# Altium schematic symbol library SCHLIB.SchLib: 2608 symbols (part 2 of 20) (continued)
## CMC-SRF2012-361YA_V1
designator CMC?, comment Case/Package: 0805  Max DC Current: 300mA  (hidden comment: 360R)
CMC 300MA 2LN 360 OHM SMD; Manufacturer: Bourns; Manufacturer Part Number: SRF2012-361YA; Core Material: Ferrite; Tolerance: 25%; Shielding: Unshielded; Number of Lines: 2; DC Resistance (DCR): 450mR; Test Frequency: 100MHz; Voltage Rating (DC): 50V; Element Configuration: Dual; Insulation Resistance: 10MR; Washability: OK; Supplier 1: Digi-Key; Stock 1: 68554; Pricing 1: 1=0.36, 10=0.322, 100=0.2214, 500=0.18918, 1000=0.1449 (USD); Mount: PCB,Surface Mount; Material: Steel; Min Operating Temperature: -40°C; Max Operating Temperature: 125°C; Packaging: Tape and Reel; Package Quantity: 1; Resistance: 360R; Current Rating: 300mA; Termination: SMD/SMT; Current: 300mA; DC Current: 300mA; Length: 2mm; Height: 1.2mm; Width: 1.2mm; Depth: 1.4mm; REACH SVHC: No SVHC; Halogen Free: Halogen Free; ComponentLink1URL: https://www.bourns.com/docs/Product-Datasheets/SRF2012A.pdf; ComponentLink1Description: https://www.bourns.com/docs/Product-Datasheets/SRF2012A.pdf; ComponentLink2URL: http://www.bourns.com/docs/Product-Datasheets/SRF2012A.pdf; ComponentLink2Description: http://www.bourns.com/docs/Product-Datasheets/SRF2012A.pdf; ComponentLink3URL: http://uk.rs-online.com/webdocs/0fa5/0900766b80fa59a2.pdf; ComponentLink3Description: http://uk.rs-online.com/webdocs/0fa5/0900766b80fa59a2.pdf; Supplier Part Number 1: SRF2012-361YADKR-ND; Impedance: 360R
footprint CMC-SRF2012A
pins: 1, 2, 3, 4

## CMC-SRF2012-361YA_V2
designator CMC?, comment Case/Package: 0805  Max DC Current: 300mA  (hidden comment: 360R)
CMC 300MA 2LN 360 OHM SMD; Manufacturer: Bourns; Manufacturer Part Number: SRF2012-361YA; Core Material: Ferrite; Tolerance: 25%; Shielding: Unshielded; Number of Lines: 2; DC Resistance (DCR): 450mR; Test Frequency: 100MHz; Voltage Rating (DC): 50V; Element Configuration: Dual; Insulation Resistance: 10MR; Washability: OK; Supplier 1: Digi-Key; Stock 1: 68554; Pricing 1: 1=0.36, 10=0.322, 100=0.2214, 500=0.18918, 1000=0.1449 (USD); Mount: PCB,Surface Mount; Material: Steel; Min Operating Temperature: -40°C; Max Operating Temperature: 125°C; Packaging: Tape and Reel; Package Quantity: 1; Resistance: 360R; Current Rating: 300mA; Termination: SMD/SMT; Current: 300mA; DC Current: 300mA; Length: 2mm; Height: 1.2mm; Width: 1.2mm; Depth: 1.4mm; REACH SVHC: No SVHC; Halogen Free: Halogen Free; ComponentLink1URL: https://www.bourns.com/docs/Product-Datasheets/SRF2012A.pdf; ComponentLink1Description: https://www.bourns.com/docs/Product-Datasheets/SRF2012A.pdf; ComponentLink2URL: http://www.bourns.com/docs/Product-Datasheets/SRF2012A.pdf; ComponentLink2Description: http://www.bourns.com/docs/Product-Datasheets/SRF2012A.pdf; ComponentLink3URL: http://uk.rs-online.com/webdocs/0fa5/0900766b80fa59a2.pdf; ComponentLink3Description: http://uk.rs-online.com/webdocs/0fa5/0900766b80fa59a2.pdf; Supplier Part Number 1: SRF2012-361YADKR-ND; Impedance: 360R
footprint CMC-SRF2012A
pins: 1, 2, 3, 4

## CMC-SRF4532-510Y
designator CMC?, comment SRF4532-510Y  DC Current: 200mA  DC Resistance (DCR): 3.5R  Inductance: 51uH
CMC 51UH 200MA 2LN 2 KOHM SMD; Manufacturer 1: Bourns; Core Material: Ferrite; Number of Lines: 2; Impedance: 2kR; Tolerance: 50%; Voltage Rating (DC): 50V; Test Frequency: 100kHz; Element Configuration: Dual; Insulation Resistance: 10MR; Washability: OK; Supplier 1: Digi-Key; Manufacturer Part Number: SRF4532-510Y; Stock 1: 34702; Pricing 1: 1=0,83000, 10=0,72500, 100=0,51750 (USD); RoHS: Yes; Mount: Surface Mount,PCB; Case/Package: 4532; Material: Steel; Contact Plating: Tin; Min Operating Temperature: -40°C; Max Operating Temperature: 125°C; Package Quantity: 1; Packaging: Tape and Reel; Resistance: 2kR; Current Rating: 200mA; Current: 200mA; Max DC Current: 200mA; Termination: SMD/SMT; Self Resonant Frequency: 100kHz; Length: 4.5mm; Height: 0.118inch; Width: 0.126inch; Depth: 3.4mm; REACH SVHC: No SVHC; Lead Free: Lead Free; ComponentLink1URL: https://datasheet.ciiva.com/6216/srf4532-6216128.pdf?src-supplier=Digi-Key; ComponentLink1Description: https://datasheet.ciiva.com/6216/srf4532-6216128.pdf?src-supplier=Digi-Key; ComponentLink2URL: https://datasheet.ciiva.com/30121/119srf4532-30121267.pdf?src-supplier=Onlinecomponents.com; ComponentLink2Description: https://datasheet.ciiva.com/30121/119srf4532-30121267.pdf?src-supplier=Onlinecomponents.com; ComponentLink3URL: https://datasheet.ciiva.com/22628/1911192-22628124.pdf?src-supplier=Element14; ComponentLink3Description: https://datasheet.ciiva.com/22628/1911192-22628124.pdf?src-supplier=Element14; ComponentLink4URL: https://datasheet.ciiva.com/6216/srf4532-6216126.pdf?src-supplier=Digi-Key; ComponentLink4Description: https://datasheet.ciiva.com/6216/srf4532-6216126.pdf?src-supplier=Digi-Key; ComponentLink5URL: https://datasheet.ciiva.com/7847/srf4532-7847902.pdf?src-supplier=Element14; ComponentLink5Description: https://datasheet.ciiva.com/7847/srf4532-7847902.pdf?src-supplier=Element14; Supplier Part Number: SRF4532-510YCT-ND
footprint CMC-1812
pins: 1, 2, 3, 4

## CMC-WCB3225-102Y-N
designator CMC?, comment 1K  Max DC Current: 1.5A  Package: 1206
CHOKE COMMON MODE 1K/100MHz 1.5A SMD; Washability: OK; Parameter 2: *
footprint CMC-WCB3225-102Y-N
pins: 1, 2, 3, 4

## CON-1X2-2.54-TH
designator J?, comment 1X2
CONN HEADER VERT 2POS 2.54MM; Manufacturer: Harwin; Manufacturer Part Number: M20-9990245; Number of Contacts: 2; Current Rating: 3A; Contact Resistance: 25mR; Mating Cycles: 300; Voltage Rating (AC): 750V; Insulation Resistance: 10GR; Gender: Male; Connector Type: Male Pin; Voltage: 50V; Washability: OK; Supplier 1: Mouser; Stock 1: 28916; Pricing 1: 1=0.15, 10=0.093, 50=0.093, 100=0.085, 1000=0.061, 10000=0.051 (USD); Mount: Through Hole; Case/Package: SIL; Weight: 0.25lb; Contact Plating: Gold; Contact Material: Brass,Bronze; Color: Black; Housing Color: Black; Housing Material: Nylon; Min Operating Temperature: -40°C; Max Operating Temperature: 105°C; Number of Rows: 1; Termination: Solder; Max Current Rating: 3A; Number of Poles: 2; Package Quantity: 1000; Packaging: Bag; Number of Positions: 2; Working Voltage: 750V; Orientation: Straight; Current: 3A; Length: 5.08mm; Height: 0.12inch; Lead Pitch: 2.54mm; Width: 0.25inch; Pitch: 2.54mm; Contact Mating Length: 0.24inch; Depth: 2.54mm; Radiation Hardening: No; REACH SVHC: No SVHC; ComponentLink1URL: http://www.farnell.com/datasheets/1681551.pdf; ComponentLink1Description: http://www.farnell.com/datasheets/1681551.pdf; ComponentLink2URL: http://uk.rs-online.com/webdocs/1388/0900766b81388728.pdf; ComponentLink2Description: http://uk.rs-online.com/webdocs/1388/0900766b81388728.pdf; ComponentLink3URL: https://cdn.harwin.com/pdfs/Harwin_PC_Connectors_M20.pdf; ComponentLink3Description: https://cdn.harwin.com/pdfs/Harwin_PC_Connectors_M20.pdf; ComponentLink4URL: http://www.mouser.com/ds/2/181/Harwin_Product_Catalog_page_206-1134556.pdf; ComponentLink4Description: http://www.mouser.com/ds/2/181/Harwin_Product_Catalog_page_206-1134556.pdf; Supplier Part Number 1: 855-M20-9990245
footprint CON-1X2-TH
pins: 1 GND_IN, 2

## CON-1X2-4.2MM
designator J?, comment L-KLS1-4.20-1X02-S
CONN HEADER VERT 2POS; Manufacturer: Molex; Current Rating: 9A; Voltage Rating: 600V; Contact Resistance: 10mR; Max Voltage Rating (DC): 600.6kV; Number of Poles: 2; Max Current Rating: 15A; Connector Type: Power,Rectangular; Working Voltage: 250V; Gender: Male; Insulation Resistance: 1GR; Pitch: 4.2mm; Approvals: UL,CSA,TUV; Glow Wire Compliant: Non-compliant; Washability: OK; Supplier 1: Digi-Key; Manufacturer Part Number: 39-28-1023; Stock 1: 12755; Pricing 1: 1=0,65000, 10=0,61000, 100=0,46760, 500=0,40660, 1000=0,33545, 5000=0,29479, 10000=0,27446 (USD); RoHS: Yes; Mount: Through Hole; Contact Plating: Tin,Copper,Bright; Contact Material: Brass; Color: Natural,Clear; Housing Color: Black; Housing Material: Nylon; Min Operating Temperature: -40°C; Max Operating Temperature: 105°C; Number of Rows: 2; Package Quantity: 1200; Packaging: Bulk; Voltage Rating (AC): 600V; Contact Gender: Male; Number of Positions: 2; Termination: Solder; Number of Contacts: 2; Orientation: Straight; Voltage Rating (DC): 600V; Number of Circuits: 2; Length: 22.32mm; Height: 12mm; Lead Pitch: 4.2mm; Row Spacing: 4.2mm; Depth: 8.3mm; Radiation Hardening: No; REACH SVHC: Unknown; Halogen Free: Low Halogen; Lead Free: Lead Free; Flammability Rating: UL94 V-2; ComponentLink1URL: https://datasheet.ciiva.com/30094/32110039281023-pcb-headers-30094576.pdf?src-supplier=Onlinecomponents.com; ComponentLink1Description: https://datasheet.ciiva.com/30094/32110039281023-pcb-headers-30094576.pdf?src-supplier=Onlinecomponents.com; ComponentLink2URL: https://datasheet.ciiva.com/5157/0039281023-pcb-headers-228438-5157638.pdf?src-supplier=Mouser; ComponentLink2Description: https://datasheet.ciiva.com/5157/0039281023-pcb-headers-228438-5157638.pdf?src-supplier=Mouser; ComponentLink3URL: https://datasheet.ciiva.com/11746/0900766b80460d9e-11746456.pdf?src-supplier=RSComponents; ComponentLink3Description: https://datasheet.ciiva.com/11746/0900766b80460d9e-11746456.pdf?src-supplier=RSComponents; ComponentLink4URL: https://datasheet.ciiva.com/26921/getdatasheetpartid-293336-26921902.pdf?src-supplier=Verical; ComponentLink4Description: https://datasheet.ciiva.com/26921/getdatasheetpartid-293336-26921902.pdf?src-supplier=Verical; ComponentLink5URL: https://datasheet.ciiva.com/19462/1968742-19462127.pdf?src-supplier=Jameco; ComponentLink5Description: https://datasheet.ciiva.com/19462/1968742-19462127.pdf?src-supplier=Jameco; ComponentLink6URL: https://datasheet.ciiva.com/20209/22-3810e-20209528.pdf?src-supplier=Rapid+Electronics; ComponentLink6Description: https://datasheet.ciiva.com/20209/22-3810e-20209528.pdf?src-supplier=Rapid+Electronics; ComponentLink7URL: https://datasheet.ciiva.com/25908/0039281023-pcb-headers-25908412.pdf?src-supplier=Avnet+Europe; ComponentLink7Description: https://datasheet.ciiva.com/25908/0039281023-pcb-headers-25908412.pdf?src-supplier=Avnet+Europe; ComponentLink8URL: https://datasheet.ciiva.com/1442/1859939-1442781.pdf?src-supplier=Element14; ComponentLink8Description: https://datasheet.ciiva.com/1442/1859939-1442781.pdf?src-supplier=Element14; Supplier Part Number 1: WM3800-ND
footprint CON-1X2-4.2MM-TH
pins: 1, 2

## CON-1X3-2.54-TH
designator J?, comment 1X3
CONN HEADER VERT 3POS 2.54MM; Manufacturer: Wurth Electronics; Manufacturer Part Number: 61300311121; Number of Positions: 3; Connector Type: Male Pin; Gender: Male; Pitch: 0.1inch; Washability: OK; ComponentLink1URL: http://www.farnell.com/datasheets/1681551.pdf; ComponentLink1Description: http://www.farnell.com/datasheets/1681551.pdf; ComponentLink2URL: http://uk.rs-online.com/webdocs/1388/0900766b81388728.pdf; ComponentLink2Description: http://uk.rs-online.com/webdocs/1388/0900766b81388728.pdf; ComponentLink3URL: https://cdn.harwin.com/pdfs/Harwin_PC_Connectors_M20.pdf; ComponentLink3Description: https://cdn.harwin.com/pdfs/Harwin_PC_Connectors_M20.pdf; ComponentLink4URL: http://www.mouser.com/ds/2/181/Harwin_Product_Catalog_page_206-1134556.pdf; ComponentLink4Description: http://www.mouser.com/ds/2/181/Harwin_Product_Catalog_page_206-1134556.pdf; Supplier 1: Digi-Key; Supplier Part Number 1: 732-5316-ND; Stock: 99893; Pricing: 1=0.13, 10=0.106, 25=0.088, 50=0.074, 100=0.067, 1000=0.061 (USD); RoHS: Yes; Mount: Through Hole; Color: Black; Contact Plating: Gold; Contact Material: Copper; Packaging: Bulk; Termination: Solder; Number of Contacts: 3; Number of Rows: 1; Contact Mating Length: 0.236inch; REACH SVHC: Unknown; Lead Free: Lead Free; ComponentLink5URL: http://www.farnell.com/cad/1737268.pdf?src-supplier=Element14; ComponentLink5Description: http://www.farnell.com/cad/1737268.pdf?src-supplier=Element14; ComponentLink6URL: https://katalog.we-online.de/em/datasheet/6130xx11121.pdf?src-supplier=Digi-Key; ComponentLink6Description: https://katalog.we-online.de/em/datasheet/6130xx11121.pdf?src-supplier=Digi-Key
footprint CON-1X3-TH
pins: 1 GND_IN, 2, 3

## CON-2POS 2.5M M
designator J?, comment 22035025
CONN HEADER VERT 2POS 2.5MM; Manufacturer: Molex; Number of Positions: 2; Contact Resistance: 20mR; Gender: Male; Voltage Rating: 250V; Current Rating: 3A; Insulation Resistance: 1GR; Shrouded: Yes (With); Test Voltage: 1kV; Glow Wire Compliant: Non-compliant; Washability: OK; Supplier 1: Digi-Key; Manufacturer Part Number: 22-03-5025; Stock 1: 25337; Pricing 1: 1=0,44000, 10=0,40900, 100=0,31330, 500=0,27240, 1000=0,22473, 5000=0,19749, 10000=0,18387 (USD); RoHS: Yes; Mount: Through Hole; Housing Material: Nylon; Contact Plating: Tin; Contact Material: Brass; Material: Nylon; Min Operating Temperature: -40°C; Max Operating Temperature: 105°C; Number of Rows: 1; Packaging: Bulk; Termination: Through Hole; Orientation: Straight; Number of Contacts: 2; Package Quantity: 24000; Number of Circuits: 2; Contact Gender: Male; Number of Poles: 2; Voltage Rating (AC): 250V; Working Voltage: 250V; Voltage Rating (DC): 250V; Pitch: 2.5mm; Lead Pitch: 2.5mm; Radiation Hardening: No; REACH SVHC: Unknown; Lead Free: Lead Free; Flammability Rating: UL94 V-0; ComponentLink1URL: https://datasheet.ciiva.com/30129/138400022035025-pcb-headers-30129808.pdf?src-supplier=Onlinecomponents.com; ComponentLink1Description: https://datasheet.ciiva.com/30129/138400022035025-pcb-headers-30129808.pdf?src-supplier=Onlinecomponents.com; ComponentLink2URL: https://datasheet.ciiva.com/11746/0900766b80da7727-11746103.pdf?src-supplier=RSComponents; ComponentLink2Description: https://datasheet.ciiva.com/11746/0900766b80da7727-11746103.pdf?src-supplier=RSComponents; ComponentLink3URL: https://datasheet.ciiva.com/25908/0022035025-pcb-headers-25908169.pdf?src-supplier=Avnet+Europe; ComponentLink3Description: https://datasheet.ciiva.com/25908/0022035025-pcb-headers-25908169.pdf?src-supplier=Avnet+Europe; ComponentLink4URL: https://datasheet.ciiva.com/34303/1930681-34303310.pdf?src-supplier=Jameco; ComponentLink4Description: https://datasheet.ciiva.com/34303/1930681-34303310.pdf?src-supplier=Jameco; ComponentLink5URL: https://datasheet.ciiva.com/5153/0022035025-pcb-headers-158403-5153950.pdf?src-supplier=Mouser; ComponentLink5Description: https://datasheet.ciiva.com/5153/0022035025-pcb-headers-158403-5153950.pdf?src-supplier=Mouser; ComponentLink6URL: https://datasheet.ciiva.com/6009/1682252-6009099.pdf?src-supplier=Farnell; ComponentLink6Description: https://datasheet.ciiva.com/6009/1682252-6009099.pdf?src-supplier=Farnell; Supplier Part Number 1: WM18886-ND
footprint CON-2POS-2.5MM-VERT m
pins: 1 GND_IN, 2

## CON-2POS-2.5MM-RA
designator J?  Pitch: 2.5mm  Mount: TH  (hidden comment: *)
CONN HEADER 2POS 2.5MM R/A TIN; Manufacturer: Molex; Number of Contacts: 2; Gender: Male; Current Rating: 3A; Contact Resistance: 20mR; Max Voltage Rating (DC): 250.25kV; Max Voltage Rating (AC): 125V; Insulation Resistance: 1GR; Connector Type: Male Pin; Voltage Rating: 250V; Shrouded: Yes (With); Test Voltage: 1kV; Glow Wire Compliant: Non-compliant; Washability: OK; Supplier 1: Digi-Key; Manufacturer Part Number: 22-05-7025; Stock 1: 27470; Pricing 1: 1=0.61, 10=0.576, 100=0.4416, 500=0.384, 1000=0.3168, 5000=0.2784, 10000=0.2592 (USD); Contact Plating: Copper,Tin; Contact Material: Brass,Bronze,Tin; Housing Material: Nylon; Housing Colour: Natural; Colour: Natural; Material: Nylon,Polyamide; Insulation Material: Nylon; Min Operating Temperature: -40°C; Max Operating Temperature: 105°C; Number of Rows: 1; Packaging: Bulk; Termination: Solder; Orientation: Right Angle; Number of Positions: 2; Number of Poles: 2; Package Quantity: 1; Voltage Rating (AC): 250V; Working Voltage: 250V; Voltage Rating (DC): 250V; Number of Circuits: 2; Contact Gender: Male; Length: 7.65mm; Height: 5.7mm; Depth: 5.1mm; Contact Mating Length: 0.138inch; Lead Pitch: 2.5mm; Radiation Hardening: No; REACH SVHC: Unknown; Lead Free: Lead Free; Flammability Rating: UL94 V-0; ComponentLink1URL: http://www.molex.com/webdocs/datasheets/pdf/en-us/0022057025_PCB_HEADERS.pdf; ComponentLink1Description: http://www.molex.com/webdocs/datasheets/pdf/en-us/0022057025_PCB_HEADERS.pdf; ComponentLink2URL: http://www.mouser.com/ds/2/276/0022057025_PCB_HEADERS-158480.pdf; ComponentLink2Description: http://www.mouser.com/ds/2/276/0022057025_PCB_HEADERS-158480.pdf; ComponentLink3URL: https://www.molex.com/pdm_docs/sd/022057025_sd.pdf; ComponentLink3Description: https://www.molex.com/pdm_docs/sd/022057025_sd.pdf; ComponentLink4URL: http://www.farnell.com/datasheets/2165316.pdf; ComponentLink4Description: http://www.farnell.com/datasheets/2165316.pdf; ComponentLink5URL: http://uk.rs-online.com/webdocs/13c2/0900766b813c2def.pdf; ComponentLink5Description: http://uk.rs-online.com/webdocs/13c2/0900766b813c2def.pdf; ComponentLink6URL: http://www.jameco.com/Jameco/Products/ProdDS/2017869.pdf; ComponentLink6Description: http://www.jameco.com/Jameco/Products/ProdDS/2017869.pdf; Supplier Part Number 1: WM18900-ND
footprint CON-2POS-2.5MM-RA
pins: 1 GND_IN, 2

## CON-2POS-2.54MM-SMD
designator J?, comment 2.54MM
TERM BLK 2P SIDE ENT 2.54MM SMD; Manufacturer: HARTING Technology; Manufacturer Part Number: 14010213102000; Current Rating: 8.4A; Gender: Receptacle; Voltage Rating: 160V; Number of Levels: 1; Number of Positions Per Level: 2; Current: 6A; Pitch: 0.1inch; Wire Gauge (Max): 26AWG; Wire Gauge (Min): 20AWG; Supplier 1: Digi-Key; Supplier Part Number 1: 1195-3656-1-ND; Stock: 967; Pricing: 1=1.05, 10=0.926, 100=0.7986 (USD); RoHS: Yes; Mount: Surface Mount; Contact Material: Copper; Color: Black; Contact Plating: Tin; Housing Material: Polymer; Material: Polymer,Glass fibre; Min Operating Temperature: -40°C; Max Operating Temperature: 125°C; Termination: Screwless; Number of Rows: 2; Orientation: Horizontal; Packaging: Tape and Reel; Voltage: 160V; Number of Contacts: 2; Number of Poles: 2; Contact Gender: Female; Length: 9.77mm; Width: 9.2mm; Depth: 5mm; REACH SVHC: No SVHC; ComponentLink1URL: https://datasheet.ciiva.com/46428/1817031-46428378.pdf?src-supplier=Element14; ComponentLink1Description: https://datasheet.ciiva.com/46428/1817031-46428378.pdf?src-supplier=Element14
footprint CON-HARTING-2POS-2.54MM
pins: 1 GND_IN, 2, MP1, MP2

## CON-2POS-2MM-SMD
designator J?, comment 2MM
CONN HEADER VERT 2POS 2MM; Manufacturer: Sullins; Manufacturer Part Number: SWR201-NRTN-S02-SA-WH; Number of Positions: 2; Connector Type: Male Pin; Pitch: 0.079inch; Number of Contacts: 4; Mating Retention: Yes (With); Sealable: No (Without); Contact Current Rating: 3A; Wire/Cable Type: Discrete; Connector System: Wire-to-Board; Plating Thickness: 2.03um; Wire/Cable Gauge: 30AWG; PCB Thickness: 1.6mm; Tail Length: 3.4mm; Contact Post Length: 0.134inch; Washability: OK; Mount: Through Hole; Color: White; Contact Plating: Tin; Package Quantity: 2000; Number of Rows: 1; Packaging: Bulk; Termination: Solder; Lead Free: Lead Free; ComponentLink1URL: http://www1.futureelectronics.com/doc/SULLINS/SWR201-NRTN-SA-WH.pdf?src-supplier=Future+Electronics; ComponentLink1Description: http://www1.futureelectronics.com/doc/SULLINS/SWR201-NRTN-SA-WH.pdf?src-supplier=Future+Electronics; ComponentLink2URL: https://s3.amazonaws.com/catalogspreads-pdf/PAGE128%202mm%20SWR201%20SINGLE%20ROW%20WAFER%20ST%20RA.pdf?src-supplier=Digi-Key; ComponentLink2Description: https://s3.amazonaws.com/catalogspreads-pdf/PAGE128%202mm%20SWR201%20SINGLE%20ROW%20WAFER%20ST%20RA.pdf?src-supplier=Digi-Key; Contact Material: Copper Alloy; Housing Color: Natural; Housing Material: Thermoplastic; Contact Shape: Square; Min Operating Temperature: -13°C; Max Operating Temperature: 185°C; Contact Gender: Male; Orientation: Straight; Strain Relief: No (Without); Backwall/Post Interruptions: No (Without); Contact Retention: No (Without); PCB Mount Alignment: No (Without); Selectively Loaded: No (Without); Length: 10mm; Height: 0.239inch; Width: 0.185inch; Contact Mating Length: 0.132inch; Radiation Hardening: No; Flammability Rating: UL94 V-0; REACH SVHC: Unknown; ComponentLink3URL: http://www.onlinecomponents.com/productFiles/mf-AMP/pgurl_1735446-4.pdf?src-supplier=Onlinecomponents.com; ComponentLink3Description: http://www.onlinecomponents.com/productFiles/mf-AMP/pgurl_1735446-4.pdf?src-supplier=Onlinecomponents.com; ComponentLink4URL: https://www.te.com/commerce/DocumentDelivery/DDEController?Action=srchrtrv&DocNm=1735446&DocType=Customer+Drawing&DocLang=English&src-supplier=Digi-Key; ComponentLink4Description: https://www.te.com/commerce/DocumentDelivery/DDEController?Action=srchrtrv&DocNm=1735446&DocType=Customer+Drawing&DocLang=English&src-supplier=Digi-Key; Supplier 1: Digi-Key; Stock 1: 67422; Pricing 1: 1=0.11, 10=0.102, 100=0.0626, 500=0.05184, 1000=0.04536, 5000=0.03888, 10000=0.0378 (USD); Supplier Part Number 1: S9463-ND
footprint CON-2POS-2MM
pins: 1 GND_IN, 2, MP1 GND_IN, MP2 GND_IN

## CON-2POS-2MM-TH
designator J?, comment 2MM
CONN HEADER VERT 2POS 2MM; Manufacturer: Sullins; Manufacturer Part Number: SWR201-NRTN-S02-SA-WH; Number of Positions: 2; Connector Type: Male Pin; Pitch: 0.079inch; Number of Contacts: 4; Mating Retention: Yes (With); Sealable: No (Without); Contact Current Rating: 3A; Wire/Cable Type: Discrete; Connector System: Wire-to-Board; Plating Thickness: 2.03um; Wire/Cable Gauge: 30AWG; PCB Thickness: 1.6mm; Tail Length: 3.4mm; Contact Post Length: 0.134inch; Washability: OK; Mount: Through Hole; Color: White; Contact Plating: Tin; Package Quantity: 2000; Number of Rows: 1; Packaging: Bulk; Termination: Solder; Lead Free: Lead Free; ComponentLink1URL: http://www1.futureelectronics.com/doc/SULLINS/SWR201-NRTN-SA-WH.pdf?src-supplier=Future+Electronics; ComponentLink1Description: http://www1.futureelectronics.com/doc/SULLINS/SWR201-NRTN-SA-WH.pdf?src-supplier=Future+Electronics; ComponentLink2URL: https://s3.amazonaws.com/catalogspreads-pdf/PAGE128%202mm%20SWR201%20SINGLE%20ROW%20WAFER%20ST%20RA.pdf?src-supplier=Digi-Key; ComponentLink2Description: https://s3.amazonaws.com/catalogspreads-pdf/PAGE128%202mm%20SWR201%20SINGLE%20ROW%20WAFER%20ST%20RA.pdf?src-supplier=Digi-Key; Contact Material: Copper Alloy; Housing Color: Natural; Housing Material: Thermoplastic; Contact Shape: Square; Min Operating Temperature: -13°C; Max Operating Temperature: 185°C; Contact Gender: Male; Orientation: Straight; Strain Relief: No (Without); Backwall/Post Interruptions: No (Without); Contact Retention: No (Without); PCB Mount Alignment: No (Without); Selectively Loaded: No (Without); Length: 10mm; Height: 0.239inch; Width: 0.185inch; Contact Mating Length: 0.132inch; Radiation Hardening: No; Flammability Rating: UL94 V-0; REACH SVHC: Unknown; ComponentLink3URL: http://www.onlinecomponents.com/productFiles/mf-AMP/pgurl_1735446-4.pdf?src-supplier=Onlinecomponents.com; ComponentLink3Description: http://www.onlinecomponents.com/productFiles/mf-AMP/pgurl_1735446-4.pdf?src-supplier=Onlinecomponents.com; ComponentLink4URL: https://www.te.com/commerce/DocumentDelivery/DDEController?Action=srchrtrv&DocNm=1735446&DocType=Customer+Drawing&DocLang=English&src-supplier=Digi-Key; ComponentLink4Description: https://www.te.com/commerce/DocumentDelivery/DDEController?Action=srchrtrv&DocNm=1735446&DocType=Customer+Drawing&DocLang=English&src-supplier=Digi-Key; Supplier 1: Digi-Key; Stock 1: 67422; Pricing 1: 1=0.11, 10=0.102, 100=0.0626, 500=0.05184, 1000=0.04536, 5000=0.03888, 10000=0.0378 (USD); Supplier Part Number 1: S9463-ND
footprint CON-2POS-2MM-TH
pins: 1 GND_IN, 2

## CON-2POS-3.7MM-PLUG
designator J?, comment 3.7MM
CONN SSL PLUG 2POS 3.7MM SOLDER; Manufacturer: Molex; Manufacturer Part Number: 503469-0200; Number of Contacts: 2; Mating Cycles: 15; Gender: Male; Voltage Rating: 500V; Current Rating: 2A; Glow Wire Compliant: Non-compliant; Supplier 1: Digi-Key; Supplier Part Number 1: WM4555CT-ND; Stock: 835; Pricing: 1=0.63, 10=0.588, 100=0.4511, 500=0.3923 (USD); RoHS: Yes; Mount: Surface Mount; Contact Plating: Tin; Color: White; Contact Material: Bronze,Tin; Housing Material: Polyamide; Housing Color: White; Min Operating Temperature: -40°C; Max Operating Temperature: 85°C; Termination: Solder; Number of Rows: 1; Connector Type: Plug; Number of Positions: 2; Fastening Type: Latch; Number of Circuits: 2; Packaging: Tape and Reel; Package Quantity: 1500; Orientation: Right Angle; Length: 9.3mm; Pitch: 3.7mm; Depth: 11.2mm; Radiation Hardening: No; REACH SVHC: Unknown; ComponentLink1URL: https://datasheet.ciiva.com/16104/975935034690200-pcb-headers-16104784.pdf?src-supplier=Onlinecomponents.com; ComponentLink1Description: https://datasheet.ciiva.com/16104/975935034690200-pcb-headers-16104784.pdf?src-supplier=Onlinecomponents.com; ComponentLink2URL: https://datasheet.ciiva.com/30058/35735034690200-pcb-headers-30058320.pdf?src-supplier=Onlinecomponents.com; ComponentLink2Description: https://datasheet.ciiva.com/30058/35735034690200-pcb-headers-30058320.pdf?src-supplier=Onlinecomponents.com; ComponentLink3URL: https://datasheet.ciiva.com/755/5034690200-sd-755859.pdf?src-supplier=Digi-Key; ComponentLink3Description: https://datasheet.ciiva.com/755/5034690200-sd-755859.pdf?src-supplier=Digi-Key; ComponentLink4URL: https://datasheet.ciiva.com/4580/5034690200-sd-155999-4580708.pdf?src-supplier=Mouser; ComponentLink4Description: https://datasheet.ciiva.com/4580/5034690200-sd-155999-4580708.pdf?src-supplier=Mouser; ComponentLink5URL: https://datasheet.ciiva.com/9468/5034690200-pcb-headers-9468116.pdf?src-supplier=Avnet; ComponentLink5Description: https://datasheet.ciiva.com/9468/5034690200-pcb-headers-9468116.pdf?src-supplier=Avnet; ComponentLink6URL: https://datasheet.ciiva.com/8049/1598460-8049992.pdf?src-supplier=Element14; ComponentLink6Description: https://datasheet.ciiva.com/8049/1598460-8049992.pdf?src-supplier=Element14; ComponentLink7URL: https://datasheet.ciiva.com/11752/0900766b80ff9c43-11752520.pdf?src-supplier=RSComponents; ComponentLink7Description: https://datasheet.ciiva.com/11752/0900766b80ff9c43-11752520.pdf?src-supplier=RSComponents; ComponentLink8URL: https://datasheet.ciiva.com/755/5034690200-sd-755860.pdf?src-supplier=Digi-Key; ComponentLink8Description: https://datasheet.ciiva.com/755/5034690200-sd-755860.pdf?src-supplier=Digi-Key; ComponentLink9URL: https://datasheet.ciiva.com/755/5034690200-sd-755861.pdf?src-supplier=Digi-Key; ComponentLink9Description: https://datasheet.ciiva.com/755/5034690200-sd-755861.pdf?src-supplier=Digi-Key; ComponentLink10URL: https://datasheet.ciiva.com/9468/5034690200-pcb-headers-9468119.pdf?src-supplier=Avnet; ComponentLink10Description: https://datasheet.ciiva.com/9468/5034690200-pcb-headers-9468119.pdf?src-supplier=Avnet; ComponentLink11URL: https://datasheet.ciiva.com/16656/5034690200-pcb-headers-16656440.pdf?src-supplier=Avnet+Europe; ComponentLink11Description: https://datasheet.ciiva.com/16656/5034690200-pcb-headers-16656440.pdf?src-supplier=Avnet+Europe
footprint CON-2POS-3.7MM-PLUG
pins: 1, 2, MP1, MP2

## CON-2POS-3.7MM-RCPT
designator J?, comment 3.7MM
CONN SSL RCPT 2POS 3.7MM SOLDER; Manufacturer: Molex; Manufacturer Part Number: 503471-0200; Current Rating: 2A; Voltage Rating: 500V; Connector Type: Receptacle; Number of Positions: 2; Mating Cycles: 15; Supplier 1: Digi-Key; Supplier Part Number 1: WM4554CT-ND; Stock: 18081; Pricing: 1=0.54, 10=0.502, 100=0.3851, 500=0.3348, 1000=0.2762 (USD); RoHS: Yes; Mount: Surface Mount; Color: White; Contact Plating: Tin; Contact Material: Bronze,Tin; Housing Color: White; Housing Material: Polyamide; Min Operating Temperature: -40°C; Max Operating Temperature: 80°C; Packaging: Tape and Reel; Package Quantity: 2000; Orientation: Right Angle; Termination: Solder; Gender: Receptacle; Number of Contacts: 2; Number of Rows: 1; Fastening Type: Latch; Length: 9.75mm; Pitch: 3.7mm; Depth: 5.6mm; Radiation Hardening: No; REACH SVHC: Unknown; ComponentLink1URL: https://datasheet.ciiva.com/738/5034710200-sd-738720.pdf?src-supplier=Digi-Key; ComponentLink1Description: https://datasheet.ciiva.com/738/5034710200-sd-738720.pdf?src-supplier=Digi-Key; ComponentLink2URL: https://datasheet.ciiva.com/4580/5034710200-sd-129892-4580657.pdf?src-supplier=Mouser; ComponentLink2Description: https://datasheet.ciiva.com/4580/5034710200-sd-129892-4580657.pdf?src-supplier=Mouser; ComponentLink3URL: https://datasheet.ciiva.com/7093/655426-7093265.pdf?src-supplier=Newark; ComponentLink3Description: https://datasheet.ciiva.com/7093/655426-7093265.pdf?src-supplier=Newark; ComponentLink4URL: https://datasheet.ciiva.com/11752/0900766b80ff9c3d-11752519.pdf?src-supplier=RSComponents; ComponentLink4Description: https://datasheet.ciiva.com/11752/0900766b80ff9c3d-11752519.pdf?src-supplier=RSComponents; ComponentLink5URL: https://datasheet.ciiva.com/8049/1598436-8049994.pdf?src-supplier=Element14; ComponentLink5Description: https://datasheet.ciiva.com/8049/1598436-8049994.pdf?src-supplier=Element14; ComponentLink6URL: https://datasheet.ciiva.com/9468/5034710200-pcb-receptacles-9468123.pdf?src-supplier=Avnet; ComponentLink6Description: https://datasheet.ciiva.com/9468/5034710200-pcb-receptacles-9468123.pdf?src-supplier=Avnet; ComponentLink7URL: https://datasheet.ciiva.com/14805/208675034710200-pcb-receptacles-14805036.pdf?src-supplier=Arrow; ComponentLink7Description: https://datasheet.ciiva.com/14805/208675034710200-pcb-receptacles-14805036.pdf?src-supplier=Arrow; ComponentLink8URL: https://datasheet.ciiva.com/738/5034710200-sd-738721.pdf?src-supplier=Digi-Key; ComponentLink8Description: https://datasheet.ciiva.com/738/5034710200-sd-738721.pdf?src-supplier=Digi-Key
footprint CON-2POS-3.7MM-RCPT
pins: 1, 2, MP1, MP2

## CON-2POS-3.96MM-SOW3
designator J?, comment Lead Pitch: 3.96mm  (hidden comment: B2P-VH(LF)(SN))
CONN HEADER VERT 2POS 3.96MM; Manufacturer: JST; Contact Resistance: 20mR; Max Current Rating: 10A; Voltage Rating (AC): 250V; Number of Positions: 2; Insulation Resistance: 1GR; Gender: Male; Connector Type: Male Pin; Washability: OK; ComponentLink2Description: Datasheet; ComponentLink2URL: http://www.jst-mfg.com/product/pdf/eng/eVH.pdf; ComponentLink1Description: Manufacturer URL; ComponentLink1URL: http://www.jst.com/home2.html; Supplier 1: Digi-Key; Manufacturer Part Number: B2P-VH(LF)(SN); Stock 1: 104903; Pricing 1: 1=0.190000, 10=0.179000, 100=0.124400, 500=0.105280, 1000=0.086150, 5000=0.076570, 10000=0.069400 (USD); RoHS: Yes; Mount: Through Hole; Number of Pins: 2; Contact Material: Brass,Tin; Contact Plating: Tin,Copper; Color: Natural; Housing Color: White; Housing Material: Polyamide; Min Operating Temperature: -25°C; Max Operating Temperature: 85°C; Number of Rows: 1; Fastening Type: Ramp; Packaging: Bulk; Current Rating: 10A; Voltage Rating (DC): 250V; Voltage Rating: 250V; Termination: Solder; Max Voltage Rating (AC): 250V; Max Voltage Rating (DC): 250V; Number of Contacts: 2; Working Voltage: 250V; Orientation: Straight; Length: 7.86mm; Height: 8.5mm; Width: 14.6mm; Pitch: 3.96mm; Contact Mating Length: 0.303inch; Depth: 8.5mm; REACH SVHC: No SVHC; Lead Free: Lead Free; ComponentLink3URL: https://datasheet.ciiva.com/11752/0900766b80826546-11752094.pdf?src-supplier=RSComponents; ComponentLink3Description: https://datasheet.ciiva.com/11752/0900766b80826546-11752094.pdf?src-supplier=RSComponents; ComponentLink4URL: https://datasheet.ciiva.com/20207/523651-20207206.pdf?src-supplier=Rapid+Electronics; ComponentLink4Description: https://datasheet.ciiva.com/20207/523651-20207206.pdf?src-supplier=Rapid+Electronics; ComponentLink5URL: https://datasheet.ciiva.com/712/evh-712456.pdf?src-supplier=Digi-Key; ComponentLink5Description: https://datasheet.ciiva.com/712/evh-712456.pdf?src-supplier=Digi-Key; ComponentLink6URL: https://datasheet.ciiva.com/8052/80543-8052029.pdf?src-supplier=Element14; ComponentLink6Description: https://datasheet.ciiva.com/8052/80543-8052029.pdf?src-supplier=Element14; Supplier Part Number 1: 455-1639-ND
footprint JST-B2P-VH(LF)(SN)_V (THD, 2-Leads, Body 8.5x7.86mm, Pitch 3.96mm)
pins: 1, 2

## CON-2POS-4MM-RA
designator J?, comment 4MM
WR-LECO_4,00MM PITCH_2PIN_SMT_HO; Manufacturer: Wurth Electronics; Manufacturer Part Number: 695402400222; Connector Type: Poke-In,Receptacle; Number of Positions: 2; Current Rating: 9A; Wire Gauge (Max): 24AWG; Wire Gauge (Min): 18AWG; ComponentLink1URL: http://www.farnell.com/datasheets/2151100.pdf?src-supplier=Farnell; ComponentLink1Description: http://www.farnell.com/datasheets/2151100.pdf?src-supplier=Farnell; ComponentLink2URL: https://katalog.we-online.de/em/datasheet/695402400222.pdf?src-supplier=Digi-Key; ComponentLink2Description: https://katalog.we-online.de/em/datasheet/695402400222.pdf?src-supplier=Digi-Key; Supplier 1: Digi-Key; Supplier Part Number 1: 732-11586-1-ND; Stock: 1827; Pricing: 1=0.79, 50=0.72, 100=0.648 (USD); RoHS: No; Mount: Surface Mount; Contact Material: Copper Alloy; Contact Plating: Tin; Housing Color: Grey; Housing Material: Glass; Min Operating Temperature: -35°C; Max Operating Temperature: 105°C; Packaging: Cut Tape; Termination: Solder
footprint CON-2POS-4MM (SMT Horizontal Entry Connector, 2p)
pins: 1, 2

## CON-2POS-9.5MM
designator J?, comment 9.5MM
CONN BARRIER STRIP 2CIRC 0.374"; Manufacturer: On-Shore Technology; Manufacturer Part Number: OSTYK51102030; Number of Circuits: 2; Current Rating: 30A; Voltage Rating: 300V; Pitch: 0.374inch; Wire Gauge (Max): 22AWG; Wire Gauge (Min): 10AWG; Supplier 1: Digi-Key; Supplier Part Number 1: ED2953-ND; Stock: 871; Pricing: 1=1, 10=0.702, 25=0.6548, 50=0.5944, 100=0.5918, 250=0.4997, 500=0.4734, 1000=0.4208, 5000=0.3419 (USD); RoHS: Yes; Mount: Through Hole; Insulation Material: Nylon; Color: Black; Min Operating Temperature: -40°C; Max Operating Temperature: 115°C; Number of Wire Entries: 2; Number of Rows: 1; Packaging: Bulk; Flammability Rating: UL94 V-0; ComponentLink1URL: https://datasheet.ciiva.com/776/ostyk511xx030-776776.pdf?src-supplier=Digi-Key; ComponentLink1Description: https://datasheet.ciiva.com/776/ostyk511xx030-776776.pdf?src-supplier=Digi-Key
footprint CON-2POS-9.5MM
pins: 1 GND_IN, 2

## CON-2X2-4.2MM-V
designator J?, comment L-KLS1-4.20-2X02-S
CONN HEADER VERT 4POS 4.2MM; Manufacturer: Molex; Max Voltage Rating (DC): 600.6kV; Voltage Rating: 600V; Current Rating: 9A; Mating Cycles: 30; Gender: Male; Contact Resistance: 10mR; Max Current Rating: 8A; Number of Positions: 4; Connector Type: Rectangular; Insulation Resistance: 1GR; Row Spacing: 5.5mm; Approvals: UL,CSA,TUV; Glow Wire Compliant: Non-compliant; Washability: OK; Supplier 1: Digi-Key; Manufacturer Part Number: 39-28-8040; Stock 1: 2184; Pricing 1: 1=1,05000, 10=0,92000, 100=0,79330, 500=0,64908, 1000=0,57696, 5000=0,50484, 10000=0,47960 (USD); RoHS: Yes; Mount: Through Hole; Contact Plating: Tin,Copper,Bright; Contact Material: Brass; Color: Natural; Material: Nylon; Housing Color: Natural; Housing Material: Nylon; Min Operating Temperature: -40°C; Max Operating Temperature: 105°C; Number of Rows: 2; Voltage Rating (AC): 600V; Contact Gender: Male; Packaging: Bulk; Package Quantity: 700; Termination: Solder; Number of Contacts: 4; Max Voltage Rating (AC): 600V; Orientation: Straight; Number of Circuits: 4; Voltage Rating (DC): 600V; Length: 10mm; Height: 12.8mm; Lead Pitch: 4.2mm; Width: 12.8mm; Pitch: 4.2mm; Depth: 11mm; Radiation Hardening: No; REACH SVHC: Unknown; Halogen Free: Low Halogen; Lead Free: Lead Free; Flammability Rating: UL94 V-0; ComponentLink1URL: https://datasheet.ciiva.com/7843/1596928-7843938.pdf?src-supplier=Element14; ComponentLink1Description: https://datasheet.ciiva.com/7843/1596928-7843938.pdf?src-supplier=Element14; ComponentLink2URL: https://datasheet.ciiva.com/22683/1722365-22683427.pdf?src-supplier=Element14; ComponentLink2Description: https://datasheet.ciiva.com/22683/1722365-22683427.pdf?src-supplier=Element14; ComponentLink3URL: https://datasheet.ciiva.com/16654/0039288040-pcb-headers-16654999.pdf?src-supplier=Avnet+Europe; ComponentLink3Description: https://datasheet.ciiva.com/16654/0039288040-pcb-headers-16654999.pdf?src-supplier=Avnet+Europe; ComponentLink4URL: https://datasheet.ciiva.com/5147/0039288040-pcb-headers-228424-5147723.pdf?src-supplier=Mouser; ComponentLink4Description: https://datasheet.ciiva.com/5147/0039288040-pcb-headers-228424-5147723.pdf?src-supplier=Mouser; ComponentLink5URL: https://datasheet.ciiva.com/11746/0900766b80d882e8-11746219.pdf?src-supplier=RSComponents; ComponentLink5Description: https://datasheet.ciiva.com/11746/0900766b80d882e8-11746219.pdf?src-supplier=RSComponents; ComponentLink6URL: https://datasheet.ciiva.com/30131/73420039288040-pcb-headers-30131996.pdf?src-supplier=Onlinecomponents.com; ComponentLink6Description: https://datasheet.ciiva.com/30131/73420039288040-pcb-headers-30131996.pdf?src-supplier=Onlinecomponents.com; ComponentLink7URL: https://datasheet.ciiva.com/19461/881346-19461679.pdf?src-supplier=Jameco; ComponentLink7Description: https://datasheet.ciiva.com/19461/881346-19461679.pdf?src-supplier=Jameco; ComponentLink8URL: https://datasheet.ciiva.com/26916/getdatasheetpartid-149656-26916395.pdf?src-supplier=Verical; ComponentLink8Description: https://datasheet.ciiva.com/26916/getdatasheetpartid-149656-26916395.pdf?src-supplier=Verical; Supplier Part Number 1: WM23801-ND
pins: 1, 2, 3, 4

## CON-2X3-TAG
designator J?  (value not drawn)
Washability: OK
footprint P-TC2030-IDC
pins: 1, 2, 3, 4, 5, 6

## CON-2X3X1.27-PROGRAMLAYICI
designator J?  (value not drawn)
CONN HEADER SMD 6POS 1.27MM; Manufacturer Part Number: FTSH-103-01-L-DV; Washability: OK
footprint P-2X3X1.27-HEADER
pins: 1, 2, 3, 4, 5, 6

## CON-2X5-4.2MM
designator J?, comment L-KLS1-4.20-2X05-S
CONN HEADER VERT 10POS 4.2MM; Manufacturer: Molex; Gender: Male; Current Rating: 7A; Number of Poles: 10; Voltage Rating (AC): 600V; Max Current Rating: 3A; Max Voltage Rating (DC): 600.6kV; Connector Type: Power,Rectangular; Working Voltage: 250V; Insulation Resistance: 1GR; Approvals: UL,CSA,TUV; Glow Wire Compliant: Non-compliant; Washability: OK; Supplier 1: Digi-Key; Manufacturer Part Number: 39-28-1103; Stock 1: 2431; Pricing 1: 1=1,39000, 10=1,26000, 100=1,07960, 500=0,89968, 1000=0,77115, 5000=0,68375, 10000=0,66833 (USD); RoHS: Yes; Mount: Through Hole; Contact Plating: Tin,Gold; Contact Material: Brass,Bronze; Color: Natural,Clear; Housing Color: Black; Housing Material: Nylon; Min Operating Temperature: -65°C; Max Operating Temperature: 105°C; Packaging: Bulk; Number of Rows: 2; Voltage Rating: 600V; Package Quantity: 250; Contact Gender: Male; Number of Positions: 10; Termination: Solder; Number of Contacts: 10; Orientation: Straight; Voltage Rating (DC): 600V; Number of Circuits: 10; Length: 101.19mm; Height: 3.5mm; Lead Pitch: 4.2mm; Pitch: 4.2mm; Row Spacing: 4.2mm; Depth: 9.39mm; Radiation Hardening: No; Halogen Free: Low Halogen; Lead Free: Lead Free; Flammability Rating: UL94 V-2; ComponentLink1URL: https://datasheet.ciiva.com/19462/1968785-19462082.pdf?src-supplier=Jameco; ComponentLink1Description: https://datasheet.ciiva.com/19462/1968785-19462082.pdf?src-supplier=Jameco; ComponentLink2URL: https://datasheet.ciiva.com/5150/0039281103-pcb-headers-159999-5150355.pdf?src-supplier=Mouser; ComponentLink2Description: https://datasheet.ciiva.com/5150/0039281103-pcb-headers-159999-5150355.pdf?src-supplier=Mouser; ComponentLink3URL: https://datasheet.ciiva.com/20209/22-3810e-20209539.pdf?src-supplier=Rapid+Electronics; ComponentLink3Description: https://datasheet.ciiva.com/20209/22-3810e-20209539.pdf?src-supplier=Rapid+Electronics; ComponentLink4URL: https://datasheet.ciiva.com/11746/0900766b80460da7-11746923.pdf?src-supplier=RSComponents; ComponentLink4Description: https://datasheet.ciiva.com/11746/0900766b80460da7-11746923.pdf?src-supplier=RSComponents; ComponentLink5URL: https://datasheet.ciiva.com/1442/1786428-1442785.pdf?src-supplier=Element14; ComponentLink5Description: https://datasheet.ciiva.com/1442/1786428-1442785.pdf?src-supplier=Element14; ComponentLink6URL: https://datasheet.ciiva.com/18453/70190699-18453847.pdf?src-supplier=Allied+Electronics; ComponentLink6Description: https://datasheet.ciiva.com/18453/70190699-18453847.pdf?src-supplier=Allied+Electronics; Supplier Part Number 1: WM3804-ND
footprint CON-2X5-4.2MM-TH
pins: 1, 2, 3, 4, 5, 6, 7, 8, 9, 10

## CON-2X6-4.2MM
designator J?, comment L-KLS1-4.20-2X06-SB
CONN HEADER VERT 12POS 4.2MM; Manufacturer: Molex; Current Rating: 9A; Voltage Rating: 600V; Max Voltage Rating (DC): 600.6kV; Contact Resistance: 10mR; Max Current Rating: 6A; Number of Positions: 12; Gender: Female; Contact Post Length: 3.5mm; Glow Wire Compliant: Non-compliant; Washability: OK; Supplier 1: Digi-Key; Manufacturer Part Number: 39-29-3126; Stock 1: 1794; Pricing 1: 1=1,74000, 10=1,57700, 100=1,35140, 500=1,12612, 1000=0,96525, 5000=0,85586, 10000=0,83655 (USD); RoHS: Yes; Mount: Through Hole; Contact Material: Brass; Contact Plating: Tin,Copper; Housing Color: Natural; Color: Natural; Housing Material: Nylon; Min Operating Temperature: -40°C; Max Operating Temperature: 105°C; Package Quantity: 225; Number of Rows: 2; Packaging: Bulk; Contact Gender: Male; Termination: Solder; Number of Contacts: 12; Orientation: Straight; Number of Circuits: 12; Height: 12.8mm; Pitch: 4.2mm; Row Spacing: 4.2mm; Radiation Hardening: No; Halogen Free: Low Halogen; ComponentLink1URL: https://datasheet.ciiva.com/30119/70260039293126-pcb-headers-30119121.pdf?src-supplier=Onlinecomponents.com; ComponentLink1Description: https://datasheet.ciiva.com/30119/70260039293126-pcb-headers-30119121.pdf?src-supplier=Onlinecomponents.com; ComponentLink2URL: https://datasheet.ciiva.com/16654/0039293126-pcb-headers-16654565.pdf?src-supplier=Avnet+Europe; ComponentLink2Description: https://datasheet.ciiva.com/16654/0039293126-pcb-headers-16654565.pdf?src-supplier=Avnet+Europe; ComponentLink3URL: https://datasheet.ciiva.com/5150/0039293126-pcb-headers-140105-5150183.pdf?src-supplier=Mouser; ComponentLink3Description: https://datasheet.ciiva.com/5150/0039293126-pcb-headers-140105-5150183.pdf?src-supplier=Mouser; ComponentLink4URL: https://datasheet.ciiva.com/19461/1299462-19461278.pdf?src-supplier=Jameco; ComponentLink4Description: https://datasheet.ciiva.com/19461/1299462-19461278.pdf?src-supplier=Jameco; ComponentLink5URL: https://datasheet.ciiva.com/1403/1596536-1403542.pdf?src-supplier=Element14; ComponentLink5Description: https://datasheet.ciiva.com/1403/1596536-1403542.pdf?src-supplier=Element14; Supplier Part Number 1: WM3848-ND
footprint CON-2X6-4.2MM-TH
pins: 1, 2, 3, 4, 5, 6, 7, 8, 9, 10, 11, 12

## CON-2X8-2MM-RA
designator J?, comment 2MM
CONN HEADER 2X8 POS 2MM R/A; Washability: OK
footprint CON-2X8-2MM-RA
pins: 1, 2, 3, 4, 5, 6, 7, 8, 9, 10, 11, 12, 13, 14, 15, 16

## CON-2x9-2MM-221Y18F22
designator J?, comment 221Y18F22
CONN MALE 2X9 POS 2MM PCB Straight.; Manufacturer: nicomatic; Washability: OK; Manufacturer Part Number: 221Y18F22
footprint CON-16POS-2MM-221Y18F22 (Nicomatic 221Y18F22)
pins: 1, 2, 3, 4, 5, 6, 7, 8, 9, 10, 11, 12, 13, 14, 15, 16, 17, 18

## CON-2X9-4.2MM
designator J?, comment L-KLS1-4.20-2X09-SB
CONN HEADER VERT 18POS 4.2MM; Manufacturer: Molex; Contact Resistance: 10mR; Number of Positions: 18; Number of Ports: 1; Max Voltage Rating (AC): 600V; Gender: Male; Connector Type: Male Pin; Row Spacing: 0.165inch; Washability: OK; Supplier 1: Digi-Key; Manufacturer Part Number: 39-28-1183; Stock 1: 102; Pricing 1: 1=2,61000, 10=2,50400, 100=2,08680, 500=1,77378, 1000=1,51293, 5000=1,35642 (USD); RoHS: Yes; Mount: Through Hole; Contact Material: Brass; Contact Plating: Tin,Copper,Bright; Color: Natural; Number of Terminals: 18; Housing Color: Natural; Housing Material: Nylon; Min Operating Temperature: -40°C; Max Operating Temperature: 105°C; Packaging: Tray; Number of Rows: 2; Fastening Type: Ramp; Termination: Solder; Number of Contacts: 18; Max Voltage Rating (DC): 600V; Orientation: Straight; Length: 39.8mm; Pitch: 4.2mm; Depth: 11mm; ComponentLink1URL: https://datasheet.ciiva.com/11748/0900766b80c67620-11748530.pdf?src-supplier=RSComponents; ComponentLink1Description: https://datasheet.ciiva.com/11748/0900766b80c67620-11748530.pdf?src-supplier=RSComponents; ComponentLink2URL: https://datasheet.ciiva.com/30232/3980039281183-pcb-headers-30232211.pdf?src-supplier=Onlinecomponents.com; ComponentLink2Description: https://datasheet.ciiva.com/30232/3980039281183-pcb-headers-30232211.pdf?src-supplier=Onlinecomponents.com; ComponentLink3URL: https://datasheet.ciiva.com/26916/getdatasheetpartid-292510-26916571.pdf?src-supplier=Verical; ComponentLink3Description: https://datasheet.ciiva.com/26916/getdatasheetpartid-292510-26916571.pdf?src-supplier=Verical; ComponentLink4URL: https://datasheet.ciiva.com/27055/1968822-27055405.pdf?src-supplier=Jameco; ComponentLink4Description: https://datasheet.ciiva.com/27055/1968822-27055405.pdf?src-supplier=Jameco; ComponentLink5URL: https://datasheet.ciiva.com/18486/039281183-sd-18486411.pdf?src-supplier=Digi-Key; ComponentLink5Description: https://datasheet.ciiva.com/18486/039281183-sd-18486411.pdf?src-supplier=Digi-Key; ComponentLink6URL: https://datasheet.ciiva.com/49273/303925-49273802.pdf?src-supplier=Jameco; ComponentLink6Description: https://datasheet.ciiva.com/49273/303925-49273802.pdf?src-supplier=Jameco; Supplier Part Number 1: WM3808-ND
footprint CON-2X9-4.2MM-TH
pins: 1, 2, 3, 4, 5, 6, 7, 8, 9, 10, 11, 12, 13, 14, 15, 16, 17, 18

## CON-3POS-1MM-SMD
designator J?, comment 1MM
CONN HEADER 1MM 3POS SMD TIN; Manufacturer: Molex; Manufacturer Part Number: 501331-0307; Number of Contacts: 3; Voltage Rating: 50V; Current Rating: 1A; Gender: Male; Connector Type: Male Pin; Contact Resistance: 20mR; Max Voltage Rating (DC): 5.05kV; Glow Wire Compliant: Non-compliant; Washability: OK; Supplier 1: Digi-Key; Supplier Part Number 1: WM7880CT-ND; Stock 1: 4520; Pricing 1: 1=0.62000, 10=0.58400, 100=0.44780, 500=0.38940 (USD); RoHS: Yes; Mount: Surface Mount; Contact Plating: Tin; Contact Material: Bronze,Tin; Color: Natural; Housing Color: Natural; Housing Material: Nylon; Min Operating Temperature: -40°C; Max Operating Temperature: 85°C; Number of Rows: 1; Termination: Solder; Packaging: Tape and Reel; Fastening Type: Detent; Number of Positions: 3; Max Voltage Rating (AC): 50V; Orientation: Vertical; Package Quantity: 1; Contact Gender: Male; Number of Circuits: 3; Length: 5.24mm; Pitch: 1mm; Depth: 3.5mm; Radiation Hardening: No; REACH SVHC: Unknown; Lead Free: Lead Free; ComponentLink1URL: https://datasheet.ciiva.com/724/5013310207-sd-724391.pdf?src-supplier=Digi-Key; ComponentLink1Description: https://datasheet.ciiva.com/724/5013310207-sd-724391.pdf?src-supplier=Digi-Key; ComponentLink2URL: https://datasheet.ciiva.com/5155/5013310307-pcb-headers-179250-5155744.pdf?src-supplier=Mouser; ComponentLink2Description: https://datasheet.ciiva.com/5155/5013310307-pcb-headers-179250-5155744.pdf?src-supplier=Mouser; ComponentLink3URL: https://datasheet.ciiva.com/9469/5013310307-pcb-headers-9469056.pdf?src-supplier=Avnet; ComponentLink3Description: https://datasheet.ciiva.com/9469/5013310307-pcb-headers-9469056.pdf?src-supplier=Avnet; ComponentLink4URL: https://datasheet.ciiva.com/30175/3755013310307-pcb-headers-30175520.pdf?src-supplier=Onlinecomponents.com; ComponentLink4Description: https://datasheet.ciiva.com/30175/3755013310307-pcb-headers-30175520.pdf?src-supplier=Onlinecomponents.com; ComponentLink5URL: https://datasheet.ciiva.com/14804/263235013310307-pcb-headers-14804423.pdf?src-supplier=Arrow; ComponentLink5Description: https://datasheet.ciiva.com/14804/263235013310307-pcb-headers-14804423.pdf?src-supplier=Arrow; ComponentLink6URL: https://datasheet.ciiva.com/11750/0900766b80b0af91-11750733.pdf?src-supplier=RSComponents; ComponentLink6Description: https://datasheet.ciiva.com/11750/0900766b80b0af91-11750733.pdf?src-supplier=RSComponents; ComponentLink7URL: https://datasheet.ciiva.com/16656/5013310307-pcb-headers-16656427.pdf?src-supplier=Avnet+Europe; ComponentLink7Description: https://datasheet.ciiva.com/16656/5013310307-pcb-headers-16656427.pdf?src-supplier=Avnet+Europe; ComponentLink8URL: https://datasheet.ciiva.com/724/5013310307-sd-724428.pdf?src-supplier=Digi-Key; ComponentLink8Description: https://datasheet.ciiva.com/724/5013310307-sd-724428.pdf?src-supplier=Digi-Key; ComponentLink9URL: https://datasheet.ciiva.com/9469/5013310307-pcb-headers-9469053.pdf?src-supplier=Avnet; ComponentLink9Description: https://datasheet.ciiva.com/9469/5013310307-pcb-headers-9469053.pdf?src-supplier=Avnet; ComponentLink10URL: https://datasheet.ciiva.com/727/5013310307-sd-727119.pdf?src-supplier=Digi-Key; ComponentLink10Description: https://datasheet.ciiva.com/727/5013310307-sd-727119.pdf?src-supplier=Digi-Key
footprint CON-3POS-1MM-SMD
pins: 1, 2, 3, MP1, MP2

## CON-3POS-2.5MM-HOUSİNG
designator J?  Connector Type: RCP  Pitch: 2.5mm  (hidden comment: *)
CONN HOUSING 3POS 2.5MM SHROUD; Manufacturer: Molex; Manufacturer Part Number: 0050375033; Number of Positions: 3; Gender: Female; Washability: OK; Supplier 1: Digi-Key; Stock 1: 10973; Pricing 1: 1=0.36, 10=0.337, 25=0.2888, 50=0.2454, 100=0.2357, 250=0.21164, 500=0.20202, 1000=0.16835, 2500=0.15392 (USD); Mount: Free Hanging; Housing Material: Nylon; Min Operating Temperature: -40°C; Max Operating Temperature: 105°C; Number of Rows: 1; Packaging: Bulk; Termination: Crimp; Number of Contacts: 3; Orientation: Straight; Fastening Type: Ramp; Length: 9.9mm; Depth: 9mm; Radiation Hardening: No; ComponentLink1URL: https://www.molex.com/pdm_docs/sd/050375033_sd.pdf; ComponentLink1Description: https://www.molex.com/pdm_docs/sd/050375033_sd.pdf; ComponentLink2URL: http://www.molex.com/webdocs/datasheets/pdf/en-us/0050375033_CRIMP_HOUSINGS.pdf; ComponentLink2Description: http://www.molex.com/webdocs/datasheets/pdf/en-us/0050375033_CRIMP_HOUSINGS.pdf; ComponentLink3URL: https://www.verical.com/server-webapp/html/getDatasheet?partID=173295; ComponentLink3Description: https://www.verical.com/server-webapp/html/getDatasheet?partID=173295; Supplier Part Number 1: WM18874-ND
pins: 1 GND_IN, 2, 3

## CON-3POS-2.5MM-RA
designator J?  Mount: TH  Orientation: RA  Pitch: 2.5mm  (hidden comment: *)